# Altium footprint library PcbLib_AirMeter.PcbLib: 31 footprints (part 1 of 2)
Each footprint in its own frame and in the unit in brackets; x right, y up, seen from the top. Pads: shape width x height; smd on the part's side, far side on the other; paste and mask are expansions set on the pad; w line width, h text height; cw(c..) or ccw(c..) is an arc to the next point about the centre after c.
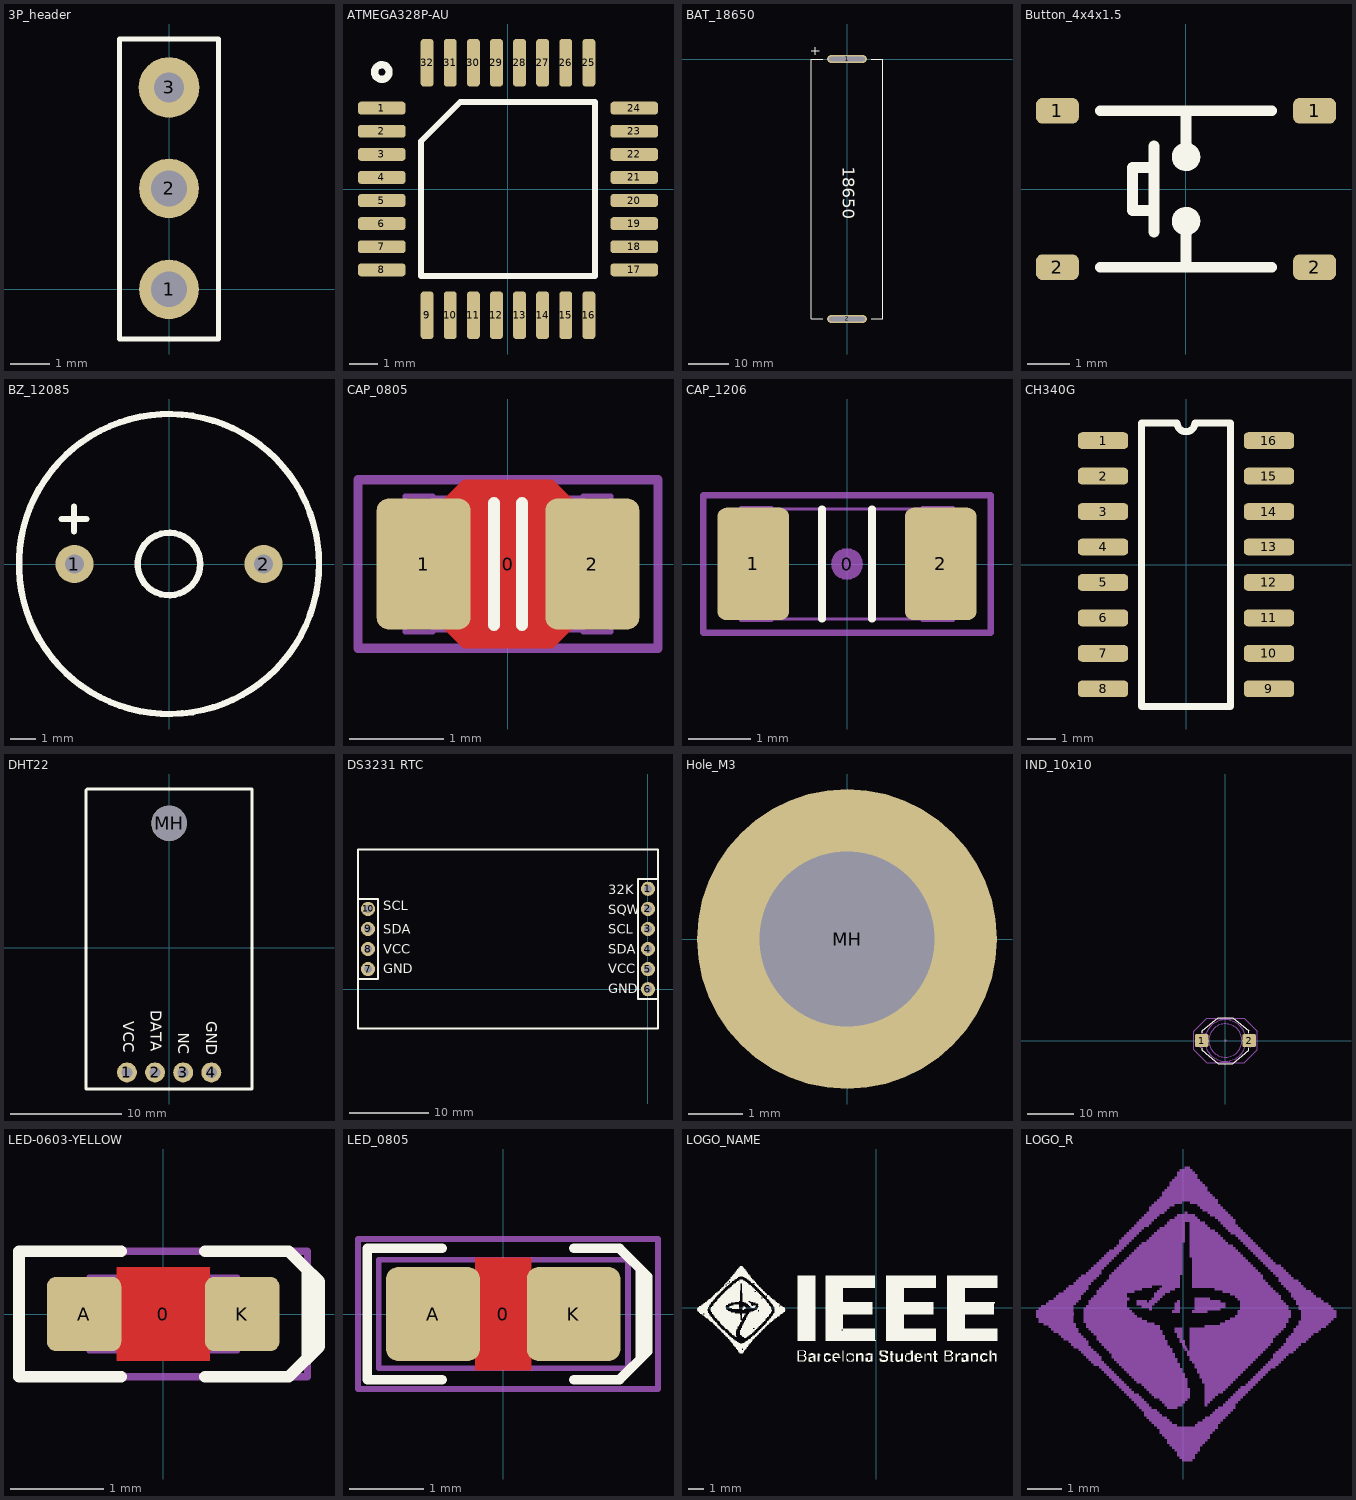
[diagram p0: the footprints below, top view; thin cyan lines are the x and y axes]

## 3P_header [mm]
pads (3):
  round 1.5 hole 0.9: 1(0,0) 2(0,2.54)
  round 1.524 hole 0.762: 3(0,5.08)
Top Overlay:
  lines w0.127: -1.25,-1.25 1.25,-1.25 1.25,6.3 -1.25,6.3 -1.25,-1.25

## ATMEGA328P-AU [mm]
pads (32):
  rrect50% 1.65x0.45 smd: 1(-4.37,2.8) 2(-4.37,2) 3(-4.37,1.2) 4(-4.37,0.4) 5(-4.37,-0.4) 6(-4.37,-1.2) 7(-4.37,-2) 8(-4.37,-2.8) 17(4.37,-2.8) 18(4.37,-2) 19(4.37,-1.2) 20(4.37,-0.4) 21(4.37,0.4) 22(4.37,1.2) 23(4.37,2) 24(4.37,2.8)
  rrect50% 0.45x1.65 smd: 9(-2.8,-4.37) 10(-2,-4.37) 11(-1.2,-4.37) 12(-0.4,-4.37) 13(0.4,-4.37) 14(1.2,-4.37) 15(2,-4.37) 16(2.8,-4.37) 25(2.8,4.37) 26(2,4.37) 27(1.2,4.37) 28(0.4,4.37) 29(-0.4,4.37) 30(-1.2,4.37) 31(-2,4.37) 32(-2.8,4.37)
Top Overlay:
  circle w0.254: c-4.37,4.05 r0.25
  lines w0.2: -3.01,-3.01 -3.01,1.65 -1.65,3.01 3.01,3.01 3.01,-3.01 -3.01,-3.01
3D body "atmega328p-au.stp": height 1.01, standoff -0.09, extent -4.5,-4.5 4.5,4.5

## BAT_18650 [mm]
pads (2):
  oval 10x2 hole 1 slot 9 at 0 deg: 1(0,0) 2(0,-65)
Top Overlay:
  lines w0.254: -9,2 -7,2 ; -8,1 -8,3 ; -6,-65 -9,-65 -9,0 -6,0 ; 6,-65 9,-65 9,0 6,0
  text "18650" at -1,-27 h3.05
3D body "User Library-Akumulator 18650.STEP": height 18.1, standoff -0.1, extent -9.6,-64.85 8.6,0.05

## Button_4x4x1.5 [mm]
pads (4):
  rrect50% 1x0.6 smd: 1(-3,1.825) 1(3,1.825) 2(-3,-1.825) 2(3,-1.825)
Top Overlay:
  circle w0.254: c0,-0.75 r0.206
  circle w0.254: c0,0.75 r0.206
  lines w0.254: -2,-1.825 2,-1.825 ; -2,1.825 2,1.825 ; -0.75,-1 -0.75,1 ; -0.75,-0.5 -1.25,-0.5 -1.25,0.5 -0.75,0.5 ; 0,-1.825 0,-0.75 ; 0,0.75 0,1.825
3D body "Button4x4x1.5.step": height 1.51, standoff 0.01, extent -3.2,-2.55 3.2,2.55

## BZ_12085 [mil] "Passive Buzzer 12x8.5"
height 334.65
pads (2):
  round 60 hole 30: 1(-149.02,0) 2(149.02,0)
Top Overlay:
  circle w10: c0,0 r236.22
  circle w10: c0,0 r49.21
  lines w10: -169.29,70.87 -129.92,70.87 ; -149.61,51.18 -149.61,90.55
3D body "CircuitWorks-BUZZER (SELFGEN).STEP": height 295.77, standoff -78.24, extent -236.22,-232.28 236.22,239.61

## CAP_0805 [mm]
pads (3):
  round 0.254 on Mech15: 0(0,0)
  rrect25% 1x1.4 smd: 1(-0.9,0) 2(0.9,0)
Top Layer:
  pour cut-out: -0.675,0.7 -0.475,0.9 0.475,0.9 0.675,0.7 0.675,-0.7 0.475,-0.9 -0.475,-0.9 -0.675,-0.7
Top Overlay:
  lines w0.127: -0.15,-0.651 -0.15,0.651 ; 0.15,-0.651 0.15,0.651
Mechanical 13:
  lines w0.05: -0.8,-0.705 0.8,-0.705 ; -0.8,0.705 0.8,0.705 ; -1.1,-0.725 -1.1,0.725 -0.8,0.725 -0.8,-0.725 -1.1,-0.725 ; 0.8,-0.725 1.1,-0.725 1.1,0.725 0.8,0.725 0.8,-0.725
Mechanical 15:
  lines w0.1: -1.6,-0.9 -1.6,0.9 1.6,0.9 1.6,-0.9 -1.6,-0.9
3D body "CAP_0805.STEP": height 1.34, standoff -0.01, extent -1.1,-0.725 1.1,0.725

## CAP_1206 [mm]
pads (3):
  round 0.508 on Mech15: 0(0,0)
  rrect25% 1.15x1.8 smd: 1(-1.5,0) 2(1.5,0)
Top Overlay:
  lines w0.127: -0.4,-0.876 -0.4,0.876 ; 0.4,-0.876 0.4,0.876
Mechanical 13:
  lines w0.05: -1.2,-0.88 1.2,-0.88 ; -1.2,0.88 1.2,0.88 ; -1.7,-0.9 -1.7,0.9 -1.2,0.9 -1.2,-0.9 -1.7,-0.9 ; 1.2,-0.9 1.2,0.9 1.7,0.9 1.7,-0.9 1.2,-0.9
Mechanical 15:
  lines w0.1: -2.3,-1.1 2.3,-1.1 2.3,1.1 -2.3,1.1 -2.3,-1.1
3D body "CAPC3216X180N - 1206 (3216 metric).STEP": height 1.8, standoff 0, extent -1.7,-0.9 1.7,0.9

## CH340G [mm]
pads (16):
  rrect50% 1.8x0.6 smd: 1(-2.972,4.445) 2(-2.972,3.175) 3(-2.972,1.905) 4(-2.972,0.635) 5(-2.972,-0.635) 6(-2.972,-1.905) 7(-2.972,-3.175) 8(-2.972,-4.445) 9(2.972,-4.445) 10(2.972,-3.175) 11(2.972,-1.905) 12(2.972,-0.635) 13(2.972,0.635) 14(2.972,1.905) 15(2.972,3.175) 16(2.972,4.445)
Top Overlay:
  lines w0.254: -1.6,-5.08 1.6,-5.08 1.6,5.08 0.318,5.08 cw(c0,5.08) -0.318,5.08 -1.6,5.08 -1.6,-5.08
3D body "User Library-CH340G.step": height 1.51, standoff 0.01, extent -4.355,-5 4.355,5

## DHT22 [mm]
pads (5):
  round 1.8 hole 1: 1(-3.81,-11.25) 2(-1.27,-11.25) 3(1.27,-11.25) 4(3.81,-11.25)
  round 3.2 hole 3.2 unplated: MH(0,11.25)
Top Overlay:
  lines w0.254: -7.51,-12.75 -7.51,14.25 -7.41,14.35 7.49,14.35 7.49,-12.75 -7.51,-12.75
  text "VCC" at -4.16,-6.65 h1
  text "DATA" at -1.66,-5.65 h1
  text "GND" at 3.34,-6.65 h1
  text "NC" at 0.84,-7.65 h1
3D body "DHT22 v5.STEP": height 7.81, standoff -5.04, extent -7.6,-11.575 7.7,14.175

## DS3231 RTC [mm] "DS3231 RTC"
pads (10):
  round 1.8 hole 1: 1(0,12.7) 2(0,10.16) 3(0,7.62) 4(0,5.08) 5(0,2.54) 6(0,0) 7(-35.433,2.54) 8(-35.433,5.08) 9(-35.433,7.62) 10(-35.433,10.16)
Top Overlay:
  lines w0.254: -36.703,1.27 -36.703,11.43 ; -36.703,1.27 -34.163,1.27 -34.163,11.43 -36.703,11.43 ; -36.703,1.27 -36.703,-4.953 1.27,-4.953 1.27,-1.27 ; -36.703,11.43 -36.703,17.653 1.27,17.653 1.27,13.97 ; 1.27,-1.27 1.27,13.97 ; 1.27,-1.27 -1.27,-1.27 -1.27,13.97 1.27,13.97
  text "32K" at -5,12 h1.2
  text "SQW" at -5,9.5 h1.2
  text "SCL" at -5,7 h1.2
  text "SDA" at -5,4.5 h1.2
  text "VCC" at -5,2 h1.2
  text "GND" at -5,-0.5 h1.2
  text "GND" at -33.5,2 h1.2
  text "VCC" at -33.5,4.5 h1.2
  text "SDA" at -33.5,7 h1.2
  text "SCL" at -33.5,10 h1.2
3D body "DS3231 Real Time Clock Module.STEP": height 13.41, standoff -5.7, extent -37.23,-4.9 1.27,17.6

## Hole_M3 [mm]
pads (1):
  round 5.5 hole 3.2: MH(0,0)

## IND_10x10 [mil]
height 157.48
pads (3):
  round 20 on Mech15: 0(0,0)
  rrect25% 115x110 smd: 1(-202.5,0) 2(202.5,0)
Top Overlay:
  lines w6: -200,-65 -200,-82.84 -62.32,-196.85 62.32,-196.85 200,-82.84 200,-65 ; -200,65 -200,82.84 -62.32,196.85 62.32,196.85 200,82.84 200,65
Mechanical 13:
  drawing of 272 lines, arcs and shapes, not listed
Mechanical 15:
  lines w3: -270,-80 -160,-190 160,-190 270,-80 270,80 160,190 -160,190 -270,80 -270,-80
3D body "Pulse Inductor RR.STEP": height 172.5, standoff 0, extent -255.38,-185 255.2,185

## LED-0603-YELLOW [mm]
height 0.8
pads (3):
  round 0.254 on Mech15: 0(0,0)
  rrect25% 0.8x0.8 smd: A(-0.85,0) K(0.85,0)
Top Layer:
  pour cut-out: -0.5,0.5 0.5,0.5 0.5,-0.5 -0.5,-0.5
Top Overlay:
  lines w0.127: -0.45,-0.675 -1.55,-0.675 -1.55,0.675 -0.45,0.675 ; 0.45,-0.675 1.35,-0.675 1.55,-0.475 1.55,0.475 1.35,0.675 0.45,0.675 ; 1.5,0.525 1.675,0.35 1.675,-0.35 1.525,-0.5
Mechanical 13:
  lines w0.05: -0.6,-0.4 -0.6,0.399 0.6,0.4 0.6,-0.4 -0.6,-0.399 ; -0.505,-0.398 -0.505,0.398 ; -0.5,-0.4 -0.8,-0.4 -0.8,0.4 -0.5,0.4 ; 0.5,-0.4 0.8,-0.4 0.8,0.4 0.5,0.4 ; 0.505,-0.398 0.505,0.398 ; -0.599,-0.398 0.599,-0.398 0.599,0.398 -0.599,0.398 -0.599,-0.398
Mechanical 15:
  lines w0.076: -1.55,-0.675 1.55,-0.675 1.55,0.675 -1.55,0.675 -1.55,-0.675
3D body "LED 0603 APT1608 YELLOW.STEP": height 0.75, standoff 0, extent -0.8,-0.4 0.8,0.4

## LED_0805 [mil]
pads (3):
  round 20 on Mech15: 0(0,0)
  rrect25% 50x50 smd: A(-37.5,0) K(37.5,0)
Top Layer:
  pour cut-out: -15,30 15,30 15,-30 -15,-30
Top Overlay:
  lines w5: -32.5,-35 -72.5,-35 -72.5,35 -32.5,35 ; 37.5,-35 62,-35 77,-20 77,20 62,35 37.5,35 ; 73,-24 73,24
Mechanical 13:
  lines w3: -66.5,-29 66.5,-29 66.5,29 -66.5,29 -66.5,-29
Mechanical 15:
  lines w3: -77.5,-40 82.5,-40 82.5,40 -77.5,40 -77.5,-40
3D body: height 31.5, standoff 11.81, extent -28.65,-24.6 26.49,24.61
3D body: height 11.81, standoff 3.94, extent -39.37,-24.61 39.37,24.61
3D body: height 3.94, standoff 0, extent -39.37,-24.61 39.37,24.61
3D body: height 3.94, standoff 0, extent -11.81,-15.75 11.81,15.75

## LOGO_NAME [mm]
Top Overlay:
  drawing of 41 lines, arcs and shapes, not listed

## LOGO_R [mm]
Bottom Overlay:
  drawing of 34 lines, arcs and shapes, not listed